# Altium schematic symbol library Analog Devices Data Converters Digital-to-Analog Converters.SchLib: 2231 symbols (part 3 of 135) (continued)
## AD557JPZ-REEL
designator U?
Single 8-Bit Low Cost Complete uP-Compatible DACPORT, 0 to +70 degC, P-20A, Pb-Free, Reel; Generic Part Number: AD557; Manufacturer: Analog Devices; PartNumber: AD557JPZ-REEL; # DAC Outputs: 1; Max V+: 5.5V; Op Pwr Diss: 125mW; Resolution (Bits): 8; Settling Time: 800ns; Single Supply: Yes; DatasheetVersion: Rev.B; PackageVersion: Nov-2002; PackageReference: P-20A; PackageDescription: 20-Lead Plastic Leaded Chip Carrier [PLCC]; Supplier 1: Digi-Key; Supplier Part Number 1: AD557JPZ-REEL-ND; Supplier 2: Newark; Supplier Part Number 2: 12M8563; Supplier 3: Mouser; Supplier Part Number 3: 584-AD557JPZ-R; Packing: Reel; RoHS: Y; Mounting Technology: Surface Mount; Code_JEDEC: MO-047-AA; ComponentLink1Description: Manufacturer URL; ComponentLink1URL: http://www.analog.com/en/index.html; ComponentLink2Description: Datasheet; ComponentLink2URL: http://www.analog.com/static/imported-files/data_sheets/AD557.pdf; ComponentLink3Description: Package Specification; ComponentLink3URL: http://www.analog.com/static/imported-files/packages/3121431516544404277643669223804694P20A.pdf; ComponentLink4Description: Product URL; ComponentLink4URL: http://www.analog.com/en/digital-to-analog-converters/da-converters/ad557/products/product.html
footprint P-20A_N (Leaded Chip Carrier, 20-Leads, Body 9x9mm, Pitch 1.27mm, IPC Medium Density)
footprint P-20A_L (Leaded Chip Carrier, 20-Leads, Body 9x9mm, Pitch 1.27mm, IPC High Density)
footprint P-20A_M (Leaded Chip Carrier, 20-Leads, Body 9x9mm, Pitch 1.27mm, IPC Low Density)
pins: 1 NC, 2 BIT8 (LSB) (in), 3 BIT7 (in), 4 BIT6 (in), 5 BIT5 (in), 6 NC, 7 BIT4 (in), 8 BIT3 (in), 9 BIT2 (in), 10 (MSB) BIT1 (in), 11 NC, 12 ~{CE} (in), 13 ~{CS} (in), 14 +VCC (power), 15 GND (power), 16 NC, 17 GND (power), 18 VOUTSENSEB (in), 19 VOUTSENSEA (in), 20 VOUT (out)

## AD557JPZ-REEL7
designator U?
Single 8-Bit Low Cost Complete uP-Compatible DACPORT, 0 to +70 degC, P-20A, Pb-Free, Reel; Generic Part Number: AD557; Manufacturer: Analog Devices; PartNumber: AD557JPZ-REEL7; # DAC Outputs: 1; Max V+: 5.5V; Op Pwr Diss: 125mW; Resolution (Bits): 8; Settling Time: 800ns; Single Supply: Yes; DatasheetVersion: Rev.B; PackageVersion: Nov-2002; PackageReference: P-20A; PackageDescription: 20-Lead Plastic Leaded Chip Carrier [PLCC]; Supplier 1: Digi-Key; Supplier Part Number 1: AD557JPZ-REEL7-ND; Supplier 2: Newark; Supplier Part Number 2: 12M8564; Supplier 3: Mouser; Supplier Part Number 3: 584-AD557JPZ-R7; Packing: Reel; RoHS: Y; Mounting Technology: Surface Mount; Code_JEDEC: MO-047-AA; ComponentLink1Description: Manufacturer URL; ComponentLink1URL: http://www.analog.com/en/index.html; ComponentLink2Description: Datasheet; ComponentLink2URL: http://www.analog.com/static/imported-files/data_sheets/AD557.pdf; ComponentLink3Description: Package Specification; ComponentLink3URL: http://www.analog.com/static/imported-files/packages/3121431516544404277643669223804694P20A.pdf; ComponentLink4Description: Product URL; ComponentLink4URL: http://www.analog.com/en/digital-to-analog-converters/da-converters/ad557/products/product.html
footprint P-20A_N (Leaded Chip Carrier, 20-Leads, Body 9x9mm, Pitch 1.27mm, IPC Medium Density)
footprint P-20A_L (Leaded Chip Carrier, 20-Leads, Body 9x9mm, Pitch 1.27mm, IPC High Density)
footprint P-20A_M (Leaded Chip Carrier, 20-Leads, Body 9x9mm, Pitch 1.27mm, IPC Low Density)
pins: 1 NC, 2 BIT8 (LSB) (in), 3 BIT7 (in), 4 BIT6 (in), 5 BIT5 (in), 6 NC, 7 BIT4 (in), 8 BIT3 (in), 9 BIT2 (in), 10 (MSB) BIT1 (in), 11 NC, 12 ~{CE} (in), 13 ~{CS} (in), 14 +VCC (power), 15 GND (power), 16 NC, 17 GND (power), 18 VOUTSENSEB (in), 19 VOUTSENSEA (in), 20 VOUT (out)

## AD558JD
designator U?
Single 8-Bit Low Cost Complete uP-Compatible DACPORT, 0 to +70 degC, D-16, Tube; Generic Part Number: AD558; Manufacturer: Analog Devices; PartNumber: AD558JD; # DAC Outputs: 1; Max V+: 16.5V; Op Pwr Diss: 375mW; Resolution (Bits): 8; Settling Time: 800ns; Single Supply: Yes; DatasheetVersion: Rev.A; PackageVersion: Oct-2004; PackageReference: D-16; PackageDescription: 16-Lead Side-Brazed Ceramic Dual In-Line Package [SBDIP]; Supplier 1: Digi-Key; Supplier Part Number 1: AD558JD-ND; Supplier 2: Newark; Supplier Part Number 2: 05F6976; Supplier 3: Mouser; Supplier Part Number 3: 584-AD558JD; Packing: Tube; RoHS: N; Mounting Technology: Through Hole; ComponentLink1Description: Manufacturer URL; ComponentLink1URL: http://www.analog.com/en/index.html; ComponentLink2Description: Datasheet; ComponentLink2URL: http://www.analog.com/static/imported-files/data_sheets/AD558.pdf; ComponentLink3Description: Package Specification; ComponentLink3URL: http://www.analog.com/static/imported-files/packages/411773807540737148809448D_16.pdf; ComponentLink4Description: Product URL; ComponentLink4URL: http://www.analog.com/en/digital-to-analog-converters/da-converters/ad558/products/product.html
footprint D-16 (DIP, 16-Leads, Row Spacing 7.62mm, Pitch 2.54mm, Body 21.3x6.7mm)
pins: 1 (LSB)  DB0 (in), 2 DB1 (in), 3 DB2 (in), 4 DB3 (in), 5 DB4 (in), 6 DB5 (in), 7 DB6 (in), 8 (MSB) DB7 (in), 9 ~{CE} (in), 10 ~{CS} (in), 11 +VCC (power), 12 GND (power), 13 GND (power), 14 VOUTSELECT (in), 15 VOUTSENSE (in), 16 VOUT (out)

## AD558JN
designator U?
Single 8-Bit Low Cost Complete uP-Compatible DACPORT, 0 to +70 degC, N-16, Tube; Generic Part Number: AD558; Manufacturer: Analog Devices; PartNumber: AD558JN; # DAC Outputs: 1; Max V+: 16.5V; Op Pwr Diss: 375mW; Resolution (Bits): 8; Settling Time: 800ns; Single Supply: Yes; DatasheetVersion: Rev.A; PackageVersion: 070706-A; PackageReference: N-16; PackageDescription: 16-Lead Plastic Dual In-Line Package [PDIP] Narrow Body; Supplier 1: Digi-Key; Supplier Part Number 1: AD558JN-ND; Supplier 2: Mouser; Supplier Part Number 2: 584-AD558JN; Packing: Tube; RoHS: N; Mounting Technology: Through Hole; Code_JEDEC: MS-001; ComponentLink1Description: Manufacturer URL; ComponentLink1URL: http://www.analog.com/en/index.html; ComponentLink2Description: Datasheet; ComponentLink2URL: http://www.analog.com/static/imported-files/data_sheets/AD558.pdf; ComponentLink3Description: Package Specification; ComponentLink3URL: http://www.analog.com/static/imported-files/packages/44768431550332N_16.pdf; ComponentLink4Description: Product URL; ComponentLink4URL: http://www.analog.com/en/digital-to-analog-converters/da-converters/ad558/products/product.html
footprint N-16 (DIP, 16-Leads, Row Spacing 7.62mm, Pitch 2.54mm, Body 20.1x6.6mm)
pins: 1 (LSB) DB0 (in), 2 DB1 (in), 3 DB2 (in), 4 DB3 (in), 5 DB4 (in), 6 DB5 (in), 7 DB6 (in), 8 (MSB) DB7 (in), 9 ~{CE} (in), 10 ~{CS} (in), 11 +VCC (power), 12 GND (power), 13 GND (power), 14 VOUT SELECT (in), 15 VOUT SENSE (in), 16 VOUT (out)

## AD558JNZ
designator U?
Single 8-Bit Low Cost Complete uP-Compatible DACPORT, 0 to +70 degC, N-16, Pb-Free, Tube; Generic Part Number: AD558; Manufacturer: Analog Devices; PartNumber: AD558JNZ; # DAC Outputs: 1; Max V+: 16.5V; Op Pwr Diss: 375mW; Resolution (Bits): 8; Settling Time: 800ns; Single Supply: Yes; DatasheetVersion: Rev.A; PackageVersion: 070706-A; PackageReference: N-16; PackageDescription: 16-Lead Plastic Dual In-Line Package [PDIP] Narrow Body; Supplier 1: Digi-Key; Supplier Part Number 1: AD558JNZ-ND; Supplier 2: Farnell; Supplier Part Number 2: 1079362; Supplier 3: Farnell; Supplier Part Number 3: 1523778; Supplier 4: Newark; Supplier Part Number 4: 59K4249; Supplier 5: Mouser; Supplier Part Number 5: 584-AD558JNZ; Packing: Tube; RoHS: Y; Mounting Technology: Through Hole; Code_JEDEC: MS-001; ComponentLink1Description: Manufacturer URL; ComponentLink1URL: http://www.analog.com/en/index.html; ComponentLink2Description: Datasheet; ComponentLink2URL: http://www.analog.com/static/imported-files/data_sheets/AD558.pdf; ComponentLink3Description: Package Specification; ComponentLink3URL: http://www.analog.com/static/imported-files/packages/44768431550332N_16.pdf; ComponentLink4Description: Product URL; ComponentLink4URL: http://www.analog.com/en/digital-to-analog-converters/da-converters/ad558/products/product.html
footprint N-16 (DIP, 16-Leads, Row Spacing 7.62mm, Pitch 2.54mm, Body 20.1x6.6mm)
pins: 1 (LSB) DB0 (in), 2 DB1 (in), 3 DB2 (in), 4 DB3 (in), 5 DB4 (in), 6 DB5 (in), 7 DB6 (in), 8 (MSB) DB7 (in), 9 ~{CE} (in), 10 ~{CS} (in), 11 +VCC (power), 12 GND (power), 13 GND (power), 14 VOUT SELECT (in), 15 VOUT SENSE (in), 16 VOUT (out)

## AD558JP
designator U?
Single 8-Bit Low Cost Complete uP-Compatible DACPORT, 0 to +70 degC, P-20A, Tube; Generic Part Number: AD558; Manufacturer: Analog Devices; PartNumber: AD558JP; # DAC Outputs: 1; Max V+: 16.5V; Op Pwr Diss: 375mW; Resolution (Bits): 8; Settling Time: 800ns; Single Supply: Yes; DatasheetVersion: Rev.A; PackageVersion: Nov-2002; PackageReference: P-20A; PackageDescription: 20-Lead Plastic Leaded Chip Carrier [PLCC]; Supplier 1: Digi-Key; Supplier Part Number 1: AD558JP-ND; Supplier 2: Newark; Supplier Part Number 2: 05F6978; Supplier 3: Mouser; Supplier Part Number 3: 584-AD558JP; Packing: Tube; RoHS: N; Mounting Technology: Surface Mount; Code_JEDEC: MO-047-AA; ComponentLink1Description: Manufacturer URL; ComponentLink1URL: http://www.analog.com/en/index.html; ComponentLink2Description: Datasheet; ComponentLink2URL: http://www.analog.com/static/imported-files/data_sheets/AD558.pdf; ComponentLink3Description: Package Specification; ComponentLink3URL: http://www.analog.com/static/imported-files/packages/3121431516544404277643669223804694P20A.pdf; ComponentLink4Description: Product URL; ComponentLink4URL: http://www.analog.com/en/digital-to-analog-converters/da-converters/ad558/products/product.html
footprint P-20A_N (Leaded Chip Carrier, 20-Leads, Body 9x9mm, Pitch 1.27mm, IPC Medium Density)
footprint P-20A_L (Leaded Chip Carrier, 20-Leads, Body 9x9mm, Pitch 1.27mm, IPC High Density)
footprint P-20A_M (Leaded Chip Carrier, 20-Leads, Body 9x9mm, Pitch 1.27mm, IPC Low Density)
pins: 1 NC, 2 DB0 (LSB) (in), 3 DB1 (in), 4 DB2 (in), 5 DB3 (in), 6 NC, 7 DB4 (in), 8 DB5 (in), 9 DB6 (in), 10 (MSB) DB7 (in), 11 NC, 12 ~{CE} (in), 13 ~{CS} (in), 14 +VCC (power), 15 GND (power), 16 NC, 17 GND (power), 18 VOUT SELECT (in), 19 VOUT SENSE (in), 20 VOUT (out)

## AD558JP-REEL7
designator U?
Single 8-Bit Low Cost Complete uP-Compatible DACPORT, 0 to +70 degC, P-20A, Reel; Generic Part Number: AD558; Manufacturer: Analog Devices; PartNumber: AD558JP-REEL7; # DAC Outputs: 1; Max V+: 16.5V; Op Pwr Diss: 375mW; Resolution (Bits): 8; Settling Time: 800ns; Single Supply: Yes; DatasheetVersion: Rev.A; PackageVersion: Nov-2002; PackageReference: P-20A; PackageDescription: 20-Lead Plastic Leaded Chip Carrier [PLCC]; Supplier 1: Digi-Key; Supplier Part Number 1: AD558JP-REEL7-ND; Supplier 2: Newark; Supplier Part Number 2: 09B5242; Supplier 3: Mouser; Supplier Part Number 3: 584-AD558JP-R7; Packing: Reel; RoHS: N; Mounting Technology: Surface Mount; Code_JEDEC: MO-047-AA; ComponentLink1Description: Manufacturer URL; ComponentLink1URL: http://www.analog.com/en/index.html; ComponentLink2Description: Datasheet; ComponentLink2URL: http://www.analog.com/static/imported-files/data_sheets/AD558.pdf; ComponentLink3Description: Package Specification; ComponentLink3URL: http://www.analog.com/static/imported-files/packages/3121431516544404277643669223804694P20A.pdf; ComponentLink4Description: Product URL; ComponentLink4URL: http://www.analog.com/en/digital-to-analog-converters/da-converters/ad558/products/product.html
footprint P-20A_N (Leaded Chip Carrier, 20-Leads, Body 9x9mm, Pitch 1.27mm, IPC Medium Density)
footprint P-20A_L (Leaded Chip Carrier, 20-Leads, Body 9x9mm, Pitch 1.27mm, IPC High Density)
footprint P-20A_M (Leaded Chip Carrier, 20-Leads, Body 9x9mm, Pitch 1.27mm, IPC Low Density)
pins: 1 NC, 2 DB0 (LSB) (in), 3 DB1 (in), 4 DB2 (in), 5 DB3 (in), 6 NC, 7 DB4 (in), 8 DB5 (in), 9 DB6 (in), 10 (MSB) DB7 (in), 11 NC, 12 ~{CE} (in), 13 ~{CS} (in), 14 +VCC (power), 15 GND (power), 16 NC, 17 GND (power), 18 VOUT SELECT (in), 19 VOUT SENSE (in), 20 VOUT (out)

## AD558JPZ
designator U?
Single 8-Bit Low Cost Complete uP-Compatible DACPORT, 0 to +70 degC, P-20A, Pb-Free, Tube; Generic Part Number: AD558; Manufacturer: Analog Devices; PartNumber: AD558JPZ; # DAC Outputs: 1; Max V+: 16.5V; Op Pwr Diss: 375mW; Resolution (Bits): 8; Settling Time: 800ns; Single Supply: Yes; DatasheetVersion: Rev.A; PackageVersion: Nov-2002; PackageReference: P-20A; PackageDescription: 20-Lead Plastic Leaded Chip Carrier [PLCC]; Supplier 1: Digi-Key; Supplier Part Number 1: AD558JPZ-ND; Supplier 2: Newark; Supplier Part Number 2: 07P8933; Supplier 3: Mouser; Supplier Part Number 3: 584-AD558JPZ; Packing: Tube; RoHS: Y; Mounting Technology: Surface Mount; Code_JEDEC: MO-047-AA; ComponentLink1Description: Manufacturer URL; ComponentLink1URL: http://www.analog.com/en/index.html; ComponentLink2Description: Datasheet; ComponentLink2URL: http://www.analog.com/static/imported-files/data_sheets/AD558.pdf; ComponentLink3Description: Package Specification; ComponentLink3URL: http://www.analog.com/static/imported-files/packages/3121431516544404277643669223804694P20A.pdf; ComponentLink4Description: Product URL; ComponentLink4URL: http://www.analog.com/en/digital-to-analog-converters/da-converters/ad558/products/product.html
footprint P-20A_N (Leaded Chip Carrier, 20-Leads, Body 9x9mm, Pitch 1.27mm, IPC Medium Density)
footprint P-20A_L (Leaded Chip Carrier, 20-Leads, Body 9x9mm, Pitch 1.27mm, IPC High Density)
footprint P-20A_M (Leaded Chip Carrier, 20-Leads, Body 9x9mm, Pitch 1.27mm, IPC Low Density)
pins: 1 NC, 2 DB0 (LSB) (in), 3 DB1 (in), 4 DB2 (in), 5 DB3 (in), 6 NC, 7 DB4 (in), 8 DB5 (in), 9 DB6 (in), 10 (MSB) DB7 (in), 11 NC, 12 ~{CE} (in), 13 ~{CS} (in), 14 +VCC (power), 15 GND (power), 16 NC, 17 GND (power), 18 VOUT SELECT (in), 19 VOUT SENSE (in), 20 VOUT (out)

## AD558JPZ-REEL
designator U?
Single 8-Bit Low Cost Complete uP-Compatible DACPORT, 0 to +70 degC, P-20A, Pb-Free, Reel; Generic Part Number: AD558; Manufacturer: Analog Devices; PartNumber: AD558JPZ-REEL; # DAC Outputs: 1; Max V+: 16.5V; Op Pwr Diss: 375mW; Resolution (Bits): 8; Settling Time: 800ns; Single Supply: Yes; DatasheetVersion: Rev.A; PackageVersion: Nov-2002; PackageReference: P-20A; PackageDescription: 20-Lead Plastic Leaded Chip Carrier [PLCC]; Supplier 1: Mouser; Supplier Part Number 1: N/A; Packing: Reel; RoHS: Y; Mounting Technology: Surface Mount; Code_JEDEC: MO-047-AA; ComponentLink1Description: Manufacturer URL; ComponentLink1URL: http://www.analog.com/en/index.html; ComponentLink2Description: Datasheet; ComponentLink2URL: http://www.analog.com/static/imported-files/data_sheets/AD558.pdf; ComponentLink3Description: Package Specification; ComponentLink3URL: http://www.analog.com/static/imported-files/packages/3121431516544404277643669223804694P20A.pdf; ComponentLink4Description: Product URL; ComponentLink4URL: http://www.analog.com/en/digital-to-analog-converters/da-converters/ad558/products/product.html
footprint P-20A_N (Leaded Chip Carrier, 20-Leads, Body 9x9mm, Pitch 1.27mm, IPC Medium Density)
footprint P-20A_L (Leaded Chip Carrier, 20-Leads, Body 9x9mm, Pitch 1.27mm, IPC High Density)
footprint P-20A_M (Leaded Chip Carrier, 20-Leads, Body 9x9mm, Pitch 1.27mm, IPC Low Density)
pins: 1 NC, 2 DB0 (LSB) (in), 3 DB1 (in), 4 DB2 (in), 5 DB3 (in), 6 NC, 7 DB4 (in), 8 DB5 (in), 9 DB6 (in), 10 (MSB) DB7 (in), 11 NC, 12 ~{CE} (in), 13 ~{CS} (in), 14 +VCC (power), 15 GND (power), 16 NC, 17 GND (power), 18 VOUT SELECT (in), 19 VOUT SENSE (in), 20 VOUT (out)

## AD558JPZ-REEL7
designator U?
Single 8-Bit Low Cost Complete uP-Compatible DACPORT, 0 to +70 degC, P-20A, Pb-Free, Reel; Generic Part Number: AD558; Manufacturer: Analog Devices; PartNumber: AD558JPZ-REEL7; # DAC Outputs: 1; Max V+: 16.5V; Op Pwr Diss: 375mW; Resolution (Bits): 8; Settling Time: 800ns; Single Supply: Yes; DatasheetVersion: Rev.A; PackageVersion: Nov-2002; PackageReference: P-20A; PackageDescription: 20-Lead Plastic Leaded Chip Carrier [PLCC]; Supplier 1: Digi-Key; Supplier Part Number 1: AD558JPZ-REEL7-ND; Supplier 2: Newark; Supplier Part Number 2: 59K4250; Supplier 3: Mouser; Supplier Part Number 3: 584-AD558JPZ-R7; Packing: Reel; RoHS: Y; Mounting Technology: Surface Mount; Code_JEDEC: MO-047-AA; ComponentLink1Description: Manufacturer URL; ComponentLink1URL: http://www.analog.com/en/index.html; ComponentLink2Description: Datasheet; ComponentLink2URL: http://www.analog.com/static/imported-files/data_sheets/AD558.pdf; ComponentLink3Description: Package Specification; ComponentLink3URL: http://www.analog.com/static/imported-files/packages/3121431516544404277643669223804694P20A.pdf; ComponentLink4Description: Product URL; ComponentLink4URL: http://www.analog.com/en/digital-to-analog-converters/da-converters/ad558/products/product.html
footprint P-20A_N (Leaded Chip Carrier, 20-Leads, Body 9x9mm, Pitch 1.27mm, IPC Medium Density)
footprint P-20A_L (Leaded Chip Carrier, 20-Leads, Body 9x9mm, Pitch 1.27mm, IPC High Density)
footprint P-20A_M (Leaded Chip Carrier, 20-Leads, Body 9x9mm, Pitch 1.27mm, IPC Low Density)
pins: 1 NC, 2 DB0 (LSB) (in), 3 DB1 (in), 4 DB2 (in), 5 DB3 (in), 6 NC, 7 DB4 (in), 8 DB5 (in), 9 DB6 (in), 10 (MSB) DB7 (in), 11 NC, 12 ~{CE} (in), 13 ~{CS} (in), 14 +VCC (power), 15 GND (power), 16 NC, 17 GND (power), 18 VOUT SELECT (in), 19 VOUT SENSE (in), 20 VOUT (out)

## AD558KD
designator U?
Single 8-Bit Low Cost Complete uP-Compatible DACPORT, 0 to +70 degC, D-16, Tube; Generic Part Number: AD558; Manufacturer: Analog Devices; PartNumber: AD558KD; # DAC Outputs: 1; Max V+: 16.5V; Op Pwr Diss: 375mW; Resolution (Bits): 8; Settling Time: 800ns; Single Supply: Yes; DatasheetVersion: Rev.A; PackageVersion: Oct-2004; PackageReference: D-16; PackageDescription: 16-Lead Side-Brazed Ceramic Dual In-Line Package [SBDIP]; Supplier 1: Digi-Key; Supplier Part Number 1: AD558KD-ND; Supplier 2: Newark; Supplier Part Number 2: 05F6979; Supplier 3: Mouser; Supplier Part Number 3: 584-AD558KD; Packing: Tube; RoHS: N; Mounting Technology: Through Hole; ComponentLink1Description: Manufacturer URL; ComponentLink1URL: http://www.analog.com/en/index.html; ComponentLink2Description: Datasheet; ComponentLink2URL: http://www.analog.com/static/imported-files/data_sheets/AD558.pdf; ComponentLink3Description: Package Specification; ComponentLink3URL: http://www.analog.com/static/imported-files/packages/411773807540737148809448D_16.pdf; ComponentLink4Description: Product URL; ComponentLink4URL: http://www.analog.com/en/digital-to-analog-converters/da-converters/ad558/products/product.html
footprint D-16 (DIP, 16-Leads, Row Spacing 7.62mm, Pitch 2.54mm, Body 21.3x6.7mm)
pins: 1 (LSB)  DB0 (in), 2 DB1 (in), 3 DB2 (in), 4 DB3 (in), 5 DB4 (in), 6 DB5 (in), 7 DB6 (in), 8 (MSB) DB7 (in), 9 ~{CE} (in), 10 ~{CS} (in), 11 +VCC (power), 12 GND (power), 13 GND (power), 14 VOUTSELECT (in), 15 VOUTSENSE (in), 16 VOUT (out)

## AD558KN
designator U?
Single 8-Bit Low Cost Complete uP-Compatible DACPORT, 0 to +70 degC, N-16, Tube; Generic Part Number: AD558; Manufacturer: Analog Devices; PartNumber: AD558KN; # DAC Outputs: 1; Max V+: 16.5V; Op Pwr Diss: 375mW; Resolution (Bits): 8; Settling Time: 800ns; Single Supply: Yes; DatasheetVersion: Rev.A; PackageVersion: 070706-A; PackageReference: N-16; PackageDescription: 16-Lead Plastic Dual In-Line Package [PDIP] Narrow Body; Supplier 1: Digi-Key; Supplier Part Number 1: AD558KN-ND; Supplier 2: Mouser; Supplier Part Number 2: 584-AD558KN; Packing: Tube; RoHS: N; Mounting Technology: Through Hole; Code_JEDEC: MS-001; ComponentLink1Description: Manufacturer URL; ComponentLink1URL: http://www.analog.com/en/index.html; ComponentLink2Description: Datasheet; ComponentLink2URL: http://www.analog.com/static/imported-files/data_sheets/AD558.pdf; ComponentLink3Description: Package Specification; ComponentLink3URL: http://www.analog.com/static/imported-files/packages/44768431550332N_16.pdf; ComponentLink4Description: Product URL; ComponentLink4URL: http://www.analog.com/en/digital-to-analog-converters/da-converters/ad558/products/product.html
footprint N-16 (DIP, 16-Leads, Row Spacing 7.62mm, Pitch 2.54mm, Body 20.1x6.6mm)
pins: 1 (LSB) DB0 (in), 2 DB1 (in), 3 DB2 (in), 4 DB3 (in), 5 DB4 (in), 6 DB5 (in), 7 DB6 (in), 8 (MSB) DB7 (in), 9 ~{CE} (in), 10 ~{CS} (in), 11 +VCC (power), 12 GND (power), 13 GND (power), 14 VOUT SELECT (in), 15 VOUT SENSE (in), 16 VOUT (out)

## AD558KNZ
designator U?
Single 8-Bit Low Cost Complete uP-Compatible DACPORT, 0 to +70 degC, N-16, Pb-Free, Tube; Generic Part Number: AD558; Manufacturer: Analog Devices; PartNumber: AD558KNZ; # DAC Outputs: 1; Max V+: 16.5V; Op Pwr Diss: 375mW; Resolution (Bits): 8; Settling Time: 800ns; Single Supply: Yes; DatasheetVersion: Rev.A; PackageVersion: 070706-A; PackageReference: N-16; PackageDescription: 16-Lead Plastic Dual In-Line Package [PDIP] Narrow Body; Supplier 1: Digi-Key; Supplier Part Number 1: AD558KNZ-ND; Supplier 2: Farnell; Supplier Part Number 2: 1438378; Supplier 3: Newark; Supplier Part Number 3: 59K4251; Supplier 4: Mouser; Supplier Part Number 4: 584-AD558KNZ; Packing: Tube; RoHS: Y; Mounting Technology: Through Hole; Code_JEDEC: MS-001; ComponentLink1Description: Manufacturer URL; ComponentLink1URL: http://www.analog.com/en/index.html; ComponentLink2Description: Datasheet; ComponentLink2URL: http://www.analog.com/static/imported-files/data_sheets/AD558.pdf; ComponentLink3Description: Package Specification; ComponentLink3URL: http://www.analog.com/static/imported-files/packages/44768431550332N_16.pdf; ComponentLink4Description: Product URL; ComponentLink4URL: http://www.analog.com/en/digital-to-analog-converters/da-converters/ad558/products/product.html
footprint N-16 (DIP, 16-Leads, Row Spacing 7.62mm, Pitch 2.54mm, Body 20.1x6.6mm)
pins: 1 (LSB) DB0 (in), 2 DB1 (in), 3 DB2 (in), 4 DB3 (in), 5 DB4 (in), 6 DB5 (in), 7 DB6 (in), 8 (MSB) DB7 (in), 9 ~{CE} (in), 10 ~{CS} (in), 11 +VCC (power), 12 GND (power), 13 GND (power), 14 VOUT SELECT (in), 15 VOUT SENSE (in), 16 VOUT (out)

## AD558KP
designator U?
Single 8-Bit Low Cost Complete uP-Compatible DACPORT, 0 to +70 degC, P-20A, Tube; Generic Part Number: AD558; Manufacturer: Analog Devices; PartNumber: AD558KP; # DAC Outputs: 1; Max V+: 16.5V; Op Pwr Diss: 375mW; Resolution (Bits): 8; Settling Time: 800ns; Single Supply: Yes; DatasheetVersion: Rev.A; PackageVersion: Nov-2002; PackageReference: P-20A; PackageDescription: 20-Lead Plastic Leaded Chip Carrier [PLCC]; Supplier 1: Digi-Key; Supplier Part Number 1: AD558KP-ND; Supplier 2: Mouser; Supplier Part Number 2: 584-AD558KP; Packing: Tube; RoHS: N; Mounting Technology: Surface Mount; Code_JEDEC: MO-047-AA; ComponentLink1Description: Manufacturer URL; ComponentLink1URL: http://www.analog.com/en/index.html; ComponentLink2Description: Datasheet; ComponentLink2URL: http://www.analog.com/static/imported-files/data_sheets/AD558.pdf; ComponentLink3Description: Package Specification; ComponentLink3URL: http://www.analog.com/static/imported-files/packages/3121431516544404277643669223804694P20A.pdf; ComponentLink4Description: Product URL; ComponentLink4URL: http://www.analog.com/en/digital-to-analog-converters/da-converters/ad558/products/product.html
footprint P-20A_N (Leaded Chip Carrier, 20-Leads, Body 9x9mm, Pitch 1.27mm, IPC Medium Density)
footprint P-20A_L (Leaded Chip Carrier, 20-Leads, Body 9x9mm, Pitch 1.27mm, IPC High Density)
footprint P-20A_M (Leaded Chip Carrier, 20-Leads, Body 9x9mm, Pitch 1.27mm, IPC Low Density)
pins: 1 NC, 2 DB0 (LSB) (in), 3 DB1 (in), 4 DB2 (in), 5 DB3 (in), 6 NC, 7 DB4 (in), 8 DB5 (in), 9 DB6 (in), 10 (MSB) DB7 (in), 11 NC, 12 ~{CE} (in), 13 ~{CS} (in), 14 +VCC (power), 15 GND (power), 16 NC, 17 GND (power), 18 VOUT SELECT (in), 19 VOUT SENSE (in), 20 VOUT (out)

## AD558KP-REEL7
designator U?
Single 8-Bit Low Cost Complete uP-Compatible DACPORT, 0 to +70 degC, P-20A, Reel; Generic Part Number: AD558; Manufacturer: Analog Devices; PartNumber: AD558KP-REEL7; # DAC Outputs: 1; Max V+: 16.5V; Op Pwr Diss: 375mW; Resolution (Bits): 8; Settling Time: 800ns; Single Supply: Yes; DatasheetVersion: Rev.A; PackageVersion: Nov-2002; PackageReference: P-20A; PackageDescription: 20-Lead Plastic Leaded Chip Carrier [PLCC]; Supplier 1: Digi-Key; Supplier Part Number 1: AD558KP-REEL7-ND; Supplier 2: Mouser; Supplier Part Number 2: 584-AD558KP-R7; Packing: Reel; RoHS: N; Mounting Technology: Surface Mount; Code_JEDEC: MO-047-AA; ComponentLink1Description: Manufacturer URL; ComponentLink1URL: http://www.analog.com/en/index.html; ComponentLink2Description: Datasheet; ComponentLink2URL: http://www.analog.com/static/imported-files/data_sheets/AD558.pdf; ComponentLink3Description: Package Specification; ComponentLink3URL: http://www.analog.com/static/imported-files/packages/3121431516544404277643669223804694P20A.pdf; ComponentLink4Description: Product URL; ComponentLink4URL: http://www.analog.com/en/digital-to-analog-converters/da-converters/ad558/products/product.html
footprint P-20A_N (Leaded Chip Carrier, 20-Leads, Body 9x9mm, Pitch 1.27mm, IPC Medium Density)
footprint P-20A_L (Leaded Chip Carrier, 20-Leads, Body 9x9mm, Pitch 1.27mm, IPC High Density)
footprint P-20A_M (Leaded Chip Carrier, 20-Leads, Body 9x9mm, Pitch 1.27mm, IPC Low Density)
pins: 1 NC, 2 DB0 (LSB) (in), 3 DB1 (in), 4 DB2 (in), 5 DB3 (in), 6 NC, 7 DB4 (in), 8 DB5 (in), 9 DB6 (in), 10 (MSB) DB7 (in), 11 NC, 12 ~{CE} (in), 13 ~{CS} (in), 14 +VCC (power), 15 GND (power), 16 NC, 17 GND (power), 18 VOUT SELECT (in), 19 VOUT SENSE (in), 20 VOUT (out)

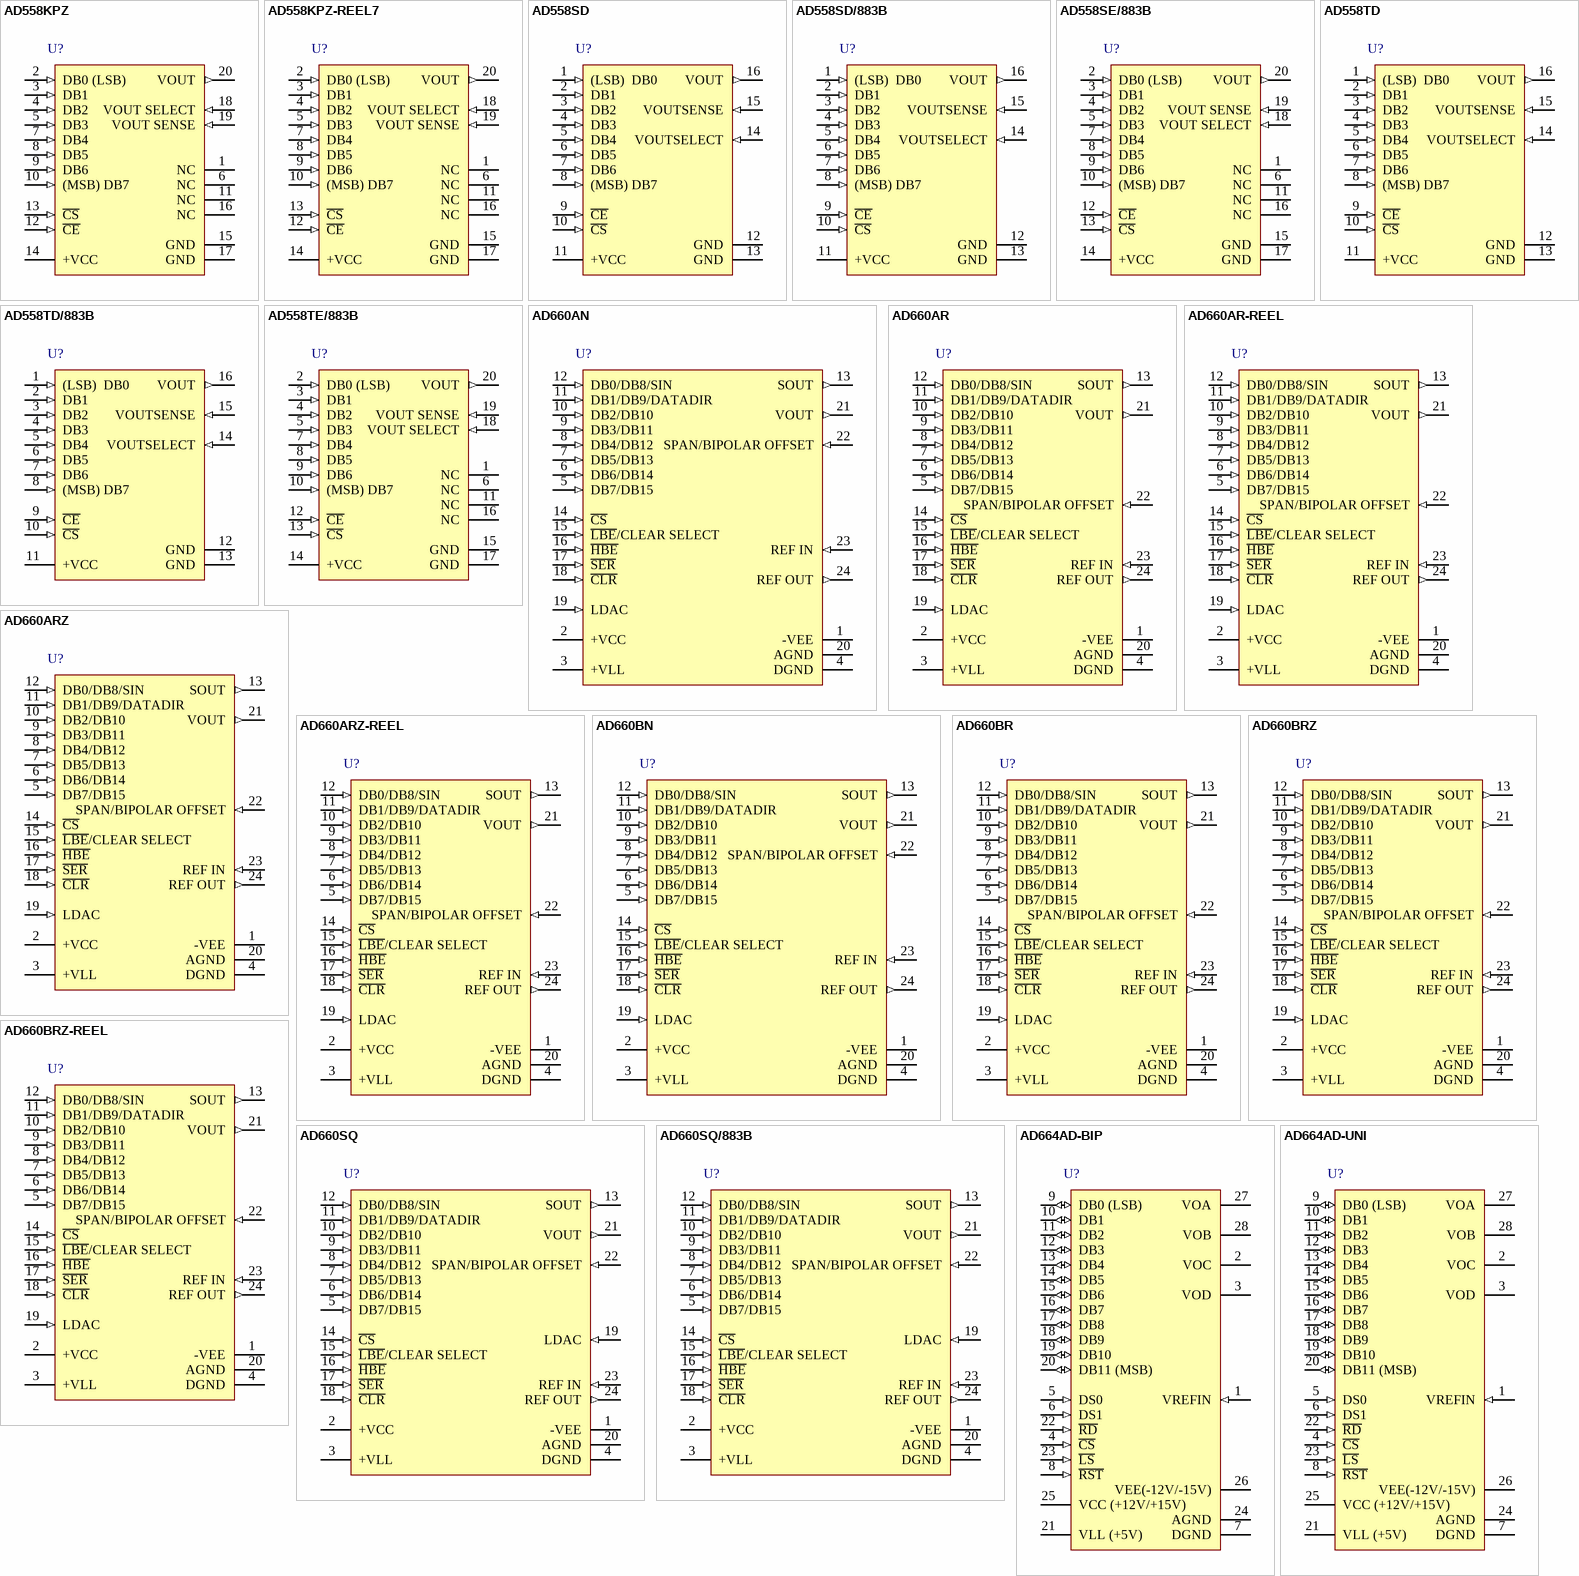
[diagram p3: symbols AD558KPZ to AD664AD-UNI]

## AD558KPZ
designator U?
Single 8-Bit Low Cost Complete uP-Compatible DACPORT, 0 to +70 degC, P-20A, Pb-Free, Tube; Generic Part Number: AD558; Manufacturer: Analog Devices; PartNumber: AD558KPZ; # DAC Outputs: 1; Max V+: 16.5V; Op Pwr Diss: 375mW; Resolution (Bits): 8; Settling Time: 800ns; Single Supply: Yes; DatasheetVersion: Rev.A; PackageVersion: Nov-2002; PackageReference: P-20A; PackageDescription: 20-Lead Plastic Leaded Chip Carrier [PLCC]; Supplier 1: Digi-Key; Supplier Part Number 1: AD558KPZ-ND; Supplier 2: Newark; Supplier Part Number 2: 59K4253; Supplier 3: Mouser; Supplier Part Number 3: 584-AD558KPZ; Packing: Tube; RoHS: Y; Mounting Technology: Surface Mount; Code_JEDEC: MO-047-AA; ComponentLink1Description: Manufacturer URL; ComponentLink1URL: http://www.analog.com/en/index.html; ComponentLink2Description: Datasheet; ComponentLink2URL: http://www.analog.com/static/imported-files/data_sheets/AD558.pdf; ComponentLink3Description: Package Specification; ComponentLink3URL: http://www.analog.com/static/imported-files/packages/3121431516544404277643669223804694P20A.pdf; ComponentLink4Description: Product URL; ComponentLink4URL: http://www.analog.com/en/digital-to-analog-converters/da-converters/ad558/products/product.html
footprint P-20A_N (Leaded Chip Carrier, 20-Leads, Body 9x9mm, Pitch 1.27mm, IPC Medium Density)
footprint P-20A_L (Leaded Chip Carrier, 20-Leads, Body 9x9mm, Pitch 1.27mm, IPC High Density)
footprint P-20A_M (Leaded Chip Carrier, 20-Leads, Body 9x9mm, Pitch 1.27mm, IPC Low Density)
pins: 1 NC, 2 DB0 (LSB) (in), 3 DB1 (in), 4 DB2 (in), 5 DB3 (in), 6 NC, 7 DB4 (in), 8 DB5 (in), 9 DB6 (in), 10 (MSB) DB7 (in), 11 NC, 12 ~{CE} (in), 13 ~{CS} (in), 14 +VCC (power), 15 GND (power), 16 NC, 17 GND (power), 18 VOUT SELECT (in), 19 VOUT SENSE (in), 20 VOUT (out)

## AD558KPZ-REEL7
designator U?
Single 8-Bit Low Cost Complete uP-Compatible DACPORT, 0 to +70 degC, P-20A, Pb-Free, Reel; Generic Part Number: AD558; Manufacturer: Analog Devices; PartNumber: AD558KPZ-REEL7; # DAC Outputs: 1; Max V+: 16.5V; Op Pwr Diss: 375mW; Resolution (Bits): 8; Settling Time: 800ns; Single Supply: Yes; DatasheetVersion: Rev.A; PackageVersion: Nov-2002; PackageReference: P-20A; PackageDescription: 20-Lead Plastic Leaded Chip Carrier [PLCC]; Supplier 1: Digi-Key; Supplier Part Number 1: AD558KPZ-REEL7-ND; Supplier 2: Mouser; Supplier Part Number 2: 584-AD558KPZ-R7; Packing: Reel; RoHS: Y; Mounting Technology: Surface Mount; Code_JEDEC: MO-047-AA; ComponentLink1Description: Manufacturer URL; ComponentLink1URL: http://www.analog.com/en/index.html; ComponentLink2Description: Datasheet; ComponentLink2URL: http://www.analog.com/static/imported-files/data_sheets/AD558.pdf; ComponentLink3Description: Package Specification; ComponentLink3URL: http://www.analog.com/static/imported-files/packages/3121431516544404277643669223804694P20A.pdf; ComponentLink4Description: Product URL; ComponentLink4URL: http://www.analog.com/en/digital-to-analog-converters/da-converters/ad558/products/product.html
footprint P-20A_N (Leaded Chip Carrier, 20-Leads, Body 9x9mm, Pitch 1.27mm, IPC Medium Density)
footprint P-20A_L (Leaded Chip Carrier, 20-Leads, Body 9x9mm, Pitch 1.27mm, IPC High Density)
footprint P-20A_M (Leaded Chip Carrier, 20-Leads, Body 9x9mm, Pitch 1.27mm, IPC Low Density)
pins: 1 NC, 2 DB0 (LSB) (in), 3 DB1 (in), 4 DB2 (in), 5 DB3 (in), 6 NC, 7 DB4 (in), 8 DB5 (in), 9 DB6 (in), 10 (MSB) DB7 (in), 11 NC, 12 ~{CE} (in), 13 ~{CS} (in), 14 +VCC (power), 15 GND (power), 16 NC, 17 GND (power), 18 VOUT SELECT (in), 19 VOUT SENSE (in), 20 VOUT (out)

## AD558SD
designator U?
Single 8-Bit Low Cost Complete uP-Compatible DACPORT, -55 to +125 degC, D-16, Tube; Generic Part Number: AD558; Manufacturer: Analog Devices; PartNumber: AD558SD; # DAC Outputs: 1; Max V+: 16.5V; Op Pwr Diss: 375mW; Resolution (Bits): 8; Settling Time: 800ns; Single Supply: Yes; DatasheetVersion: Rev.A; PackageVersion: Oct-2004; PackageReference: D-16; PackageDescription: 16-Lead Side-Brazed Ceramic Dual In-Line Package [SBDIP]; Supplier 1: Digi-Key; Supplier Part Number 1: AD558SD-ND; Supplier 2: Mouser; Supplier Part Number 2: 584-AD558SD; Packing: Tube; RoHS: N; Mounting Technology: Through Hole; ComponentLink1Description: Manufacturer URL; ComponentLink1URL: http://www.analog.com/en/index.html; ComponentLink2Description: Datasheet; ComponentLink2URL: http://www.analog.com/static/imported-files/data_sheets/AD558.pdf; ComponentLink3Description: Package Specification; ComponentLink3URL: http://www.analog.com/static/imported-files/packages/411773807540737148809448D_16.pdf; ComponentLink4Description: Product URL; ComponentLink4URL: http://www.analog.com/en/digital-to-analog-converters/da-converters/ad558/products/product.html
footprint D-16 (DIP, 16-Leads, Row Spacing 7.62mm, Pitch 2.54mm, Body 21.3x6.7mm)
pins: 1 (LSB)  DB0 (in), 2 DB1 (in), 3 DB2 (in), 4 DB3 (in), 5 DB4 (in), 6 DB5 (in), 7 DB6 (in), 8 (MSB) DB7 (in), 9 ~{CE} (in), 10 ~{CS} (in), 11 +VCC (power), 12 GND (power), 13 GND (power), 14 VOUTSELECT (in), 15 VOUTSENSE (in), 16 VOUT (out)

## AD558SD/883B
designator U?
Single 8-Bit Low Cost Complete uP-Compatible DACPORT, -55 to +125 degC, D-16, Tube; Generic Part Number: AD558; Manufacturer: Analog Devices; PartNumber: AD558SD/883B; # DAC Outputs: 1; Max V+: 16.5V; Op Pwr Diss: 375mW; Resolution (Bits): 8; Settling Time: 800ns; Single Supply: Yes; DatasheetVersion: Rev.A; PackageVersion: Oct-2004; PackageReference: D-16; PackageDescription: 16-Lead Side-Brazed Ceramic Dual In-Line Package [SBDIP]; Supplier 1: Mouser; Supplier Part Number 1: 584-AD558SD883B; Packing: Tube; RoHS: N; Mounting Technology: Through Hole; ComponentLink1Description: Manufacturer URL; ComponentLink1URL: http://www.analog.com/en/index.html; ComponentLink2Description: Datasheet; ComponentLink2URL: http://www.analog.com/static/imported-files/data_sheets/AD558.pdf; ComponentLink3Description: Package Specification; ComponentLink3URL: http://www.analog.com/static/imported-files/packages/411773807540737148809448D_16.pdf; ComponentLink4Description: Product URL; ComponentLink4URL: http://www.analog.com/en/digital-to-analog-converters/da-converters/ad558/products/product.html
footprint D-16 (DIP, 16-Leads, Row Spacing 7.62mm, Pitch 2.54mm, Body 21.3x6.7mm)
pins: 1 (LSB)  DB0 (in), 2 DB1 (in), 3 DB2 (in), 4 DB3 (in), 5 DB4 (in), 6 DB5 (in), 7 DB6 (in), 8 (MSB) DB7 (in), 9 ~{CE} (in), 10 ~{CS} (in), 11 +VCC (power), 12 GND (power), 13 GND (power), 14 VOUTSELECT (in), 15 VOUTSENSE (in), 16 VOUT (out)

## AD558SE/883B
designator U?
Single 8-Bit Low Cost Complete uP-Compatible DACPORT, -55 to +125 degC, E-20-1, Tube; Generic Part Number: AD558; Manufacturer: Analog Devices; PartNumber: AD558SE/883B; # DAC Outputs: 1; Max V+: 16.5V; Op Pwr Diss: 375mW; Resolution (Bits): 8; Settling Time: 800ns; Single Supply: Yes; DatasheetVersion: Rev.A; PackageVersion: 022106-A; PackageReference: E-20-1; PackageDescription: 20-Terminal Ceramic Leadless Chip Carrier [LCC]; Supplier 1: Mouser; Supplier Part Number 1: 584-AD558SE883B; Packing: Tube; RoHS: N; Mounting Technology: Surface Mount; ComponentLink1Description: Manufacturer URL; ComponentLink1URL: http://www.analog.com/en/index.html; ComponentLink2Description: Datasheet; ComponentLink2URL: http://www.analog.com/static/imported-files/data_sheets/AD558.pdf; ComponentLink3Description: Package Specification; ComponentLink3URL: http://www.analog.com/static/imported-files/packages/PKG_PDF/LCC(E)/E_20_1.pdf; ComponentLink4Description: Product URL; ComponentLink4URL: http://www.analog.com/en/digital-to-analog-converters/da-converters/ad558/products/product.html
footprint E-20-1_N (Leadless Chip Carrier, 20-Leads, Body 8.9x8.9mm, Pitch 1.27mm, IPC Medium Density)
footprint E-20-1_L (Leadless Chip Carrier, 20-Leads, Body 8.9x8.9mm, Pitch 1.27mm, IPC High Density)
footprint E-20-1_M (Leadless Chip Carrier, 20-Leads, Body 8.9x8.9mm, Pitch 1.27mm, IPC Low Density)
pins: 1 NC, 2 DB0 (LSB) (in), 3 DB1 (in), 4 DB2 (in), 5 DB3 (in), 6 NC, 7 DB4 (in), 8 DB5 (in), 9 DB6 (in), 10 (MSB) DB7 (in), 11 NC, 12 ~{CE} (in), 13 ~{CS} (in), 14 +VCC (power), 15 GND (power), 16 NC, 17 GND (power), 18 VOUT SELECT (in), 19 VOUT SENSE (in), 20 VOUT (out)

## AD558TD
designator U?
Single 8-Bit Low Cost Complete uP-Compatible DACPORT, -55 to +125 degC, D-16, Tube; Generic Part Number: AD558; Manufacturer: Analog Devices; PartNumber: AD558TD; # DAC Outputs: 1; Max V+: 16.5V; Op Pwr Diss: 375mW; Resolution (Bits): 8; Settling Time: 800ns; Single Supply: Yes; DatasheetVersion: Rev.A; PackageVersion: Oct-2004; PackageReference: D-16; PackageDescription: 16-Lead Side-Brazed Ceramic Dual In-Line Package [SBDIP]; Supplier 1: Digi-Key; Supplier Part Number 1: AD558TD-ND; Supplier 2: Newark; Supplier Part Number 2: 05F6983; Supplier 3: Mouser; Supplier Part Number 3: 584-AD558TD; Packing: Tube; RoHS: N; Mounting Technology: Through Hole; ComponentLink1Description: Manufacturer URL; ComponentLink1URL: http://www.analog.com/en/index.html; ComponentLink2Description: Datasheet; ComponentLink2URL: http://www.analog.com/static/imported-files/data_sheets/AD558.pdf; ComponentLink3Description: Package Specification; ComponentLink3URL: http://www.analog.com/static/imported-files/packages/411773807540737148809448D_16.pdf; ComponentLink4Description: Product URL; ComponentLink4URL: http://www.analog.com/en/digital-to-analog-converters/da-converters/ad558/products/product.html
footprint D-16 (DIP, 16-Leads, Row Spacing 7.62mm, Pitch 2.54mm, Body 21.3x6.7mm)
pins: 1 (LSB)  DB0 (in), 2 DB1 (in), 3 DB2 (in), 4 DB3 (in), 5 DB4 (in), 6 DB5 (in), 7 DB6 (in), 8 (MSB) DB7 (in), 9 ~{CE} (in), 10 ~{CS} (in), 11 +VCC (power), 12 GND (power), 13 GND (power), 14 VOUTSELECT (in), 15 VOUTSENSE (in), 16 VOUT (out)

## AD558TD/883B
designator U?
Single 8-Bit Low Cost Complete uP-Compatible DACPORT, -55 to +125 degC, D-16, Tube; Generic Part Number: AD558; Manufacturer: Analog Devices; PartNumber: AD558TD/883B; # DAC Outputs: 1; Max V+: 16.5V; Op Pwr Diss: 375mW; Resolution (Bits): 8; Settling Time: 800ns; Single Supply: Yes; DatasheetVersion: Rev.A; PackageVersion: Oct-2004; PackageReference: D-16; PackageDescription: 16-Lead Side-Brazed Ceramic Dual In-Line Package [SBDIP]; Supplier 1: Mouser; Supplier Part Number 1: 584-AD558TD883B; Packing: Tube; RoHS: N; Mounting Technology: Through Hole; ComponentLink1Description: Manufacturer URL; ComponentLink1URL: http://www.analog.com/en/index.html; ComponentLink2Description: Datasheet; ComponentLink2URL: http://www.analog.com/static/imported-files/data_sheets/AD558.pdf; ComponentLink3Description: Package Specification; ComponentLink3URL: http://www.analog.com/static/imported-files/packages/411773807540737148809448D_16.pdf; ComponentLink4Description: Product URL; ComponentLink4URL: http://www.analog.com/en/digital-to-analog-converters/da-converters/ad558/products/product.html
footprint D-16 (DIP, 16-Leads, Row Spacing 7.62mm, Pitch 2.54mm, Body 21.3x6.7mm)
pins: 1 (LSB)  DB0 (in), 2 DB1 (in), 3 DB2 (in), 4 DB3 (in), 5 DB4 (in), 6 DB5 (in), 7 DB6 (in), 8 (MSB) DB7 (in), 9 ~{CE} (in), 10 ~{CS} (in), 11 +VCC (power), 12 GND (power), 13 GND (power), 14 VOUTSELECT (in), 15 VOUTSENSE (in), 16 VOUT (out)

## AD558TE/883B
designator U?
Single 8-Bit Low Cost Complete uP-Compatible DACPORT, -55 to +125 degC, E-20-1, Tube; Generic Part Number: AD558; Manufacturer: Analog Devices; PartNumber: AD558TE/883B; # DAC Outputs: 1; Max V+: 16.5V; Op Pwr Diss: 375mW; Resolution (Bits): 8; Settling Time: 800ns; Single Supply: Yes; DatasheetVersion: Rev.A; PackageVersion: 022106-A; PackageReference: E-20-1; PackageDescription: 20-Terminal Ceramic Leadless Chip Carrier [LCC]; Supplier 1: Mouser; Supplier Part Number 1: 584-AD558TE883B; Packing: Tube; RoHS: N; Mounting Technology: Surface Mount; ComponentLink1Description: Manufacturer URL; ComponentLink1URL: http://www.analog.com/en/index.html; ComponentLink2Description: Datasheet; ComponentLink2URL: http://www.analog.com/static/imported-files/data_sheets/AD558.pdf; ComponentLink3Description: Package Specification; ComponentLink3URL: http://www.analog.com/static/imported-files/packages/PKG_PDF/LCC(E)/E_20_1.pdf; ComponentLink4Description: Product URL; ComponentLink4URL: http://www.analog.com/en/digital-to-analog-converters/da-converters/ad558/products/product.html
footprint E-20-1_N (Leadless Chip Carrier, 20-Leads, Body 8.9x8.9mm, Pitch 1.27mm, IPC Medium Density)
footprint E-20-1_L (Leadless Chip Carrier, 20-Leads, Body 8.9x8.9mm, Pitch 1.27mm, IPC High Density)
footprint E-20-1_M (Leadless Chip Carrier, 20-Leads, Body 8.9x8.9mm, Pitch 1.27mm, IPC Low Density)
pins: 1 NC, 2 DB0 (LSB) (in), 3 DB1 (in), 4 DB2 (in), 5 DB3 (in), 6 NC, 7 DB4 (in), 8 DB5 (in), 9 DB6 (in), 10 (MSB) DB7 (in), 11 NC, 12 ~{CE} (in), 13 ~{CS} (in), 14 +VCC (power), 15 GND (power), 16 NC, 17 GND (power), 18 VOUT SELECT (in), 19 VOUT SENSE (in), 20 VOUT (out)

## AD660AN
designator U?
Single 16-Bit Monolithic DACPORT, -40 to +85 degC, N-24-1, Tube; Generic Part Number: AD660; Manufacturer: Analog Devices; PartNumber: AD660AN; # DAC Outputs: 1; Max V+: 16.5V; Op Pwr Diss: 625mW; Resolution (Bits): 16; Settling Time: 6µs; Single Supply: No; DatasheetVersion: Rev.B; PackageVersion: 071006-A; PackageReference: N-24-1; PackageDescription: 24-Lead Plastic Dual In-Line Package [PDIP] Narrow Body; Supplier 1: Digi-Key; Supplier Part Number 1: AD660AN-ND; Supplier 2: Newark; Supplier Part Number 2: 66F5806; Supplier 3: Mouser; Supplier Part Number 3: 584-AD660AN; Packing: Tube; RoHS: N; Mounting Technology: Through Hole; Code_JEDEC: MS-001; ComponentLink1Description: Manufacturer URL; ComponentLink1URL: http://www.analog.com/en/index.html; ComponentLink2Description: Datasheet; ComponentLink2URL: http://www.analog.com/static/imported-files/data_sheets/AD660.pdf; ComponentLink3Description: Package Specification; ComponentLink3URL: http://www.analog.com/static/imported-files/packages/50726455539629N_24_1.pdf; ComponentLink4Description: Product URL; ComponentLink4URL: http://www.analog.com/en/digital-to-analog-converters/da-converters/ad660/products/product.html
footprint N-24-1 (DIP, 24-Leads, Row Spacing 7.62mm, Pitch 2.54mm, Body 31.9x6.6mm)
pins: 1 -VEE (power) "Negative Analog Supply Pin", 2 +VCC (power) "Positive Analog Supply Pin", 3 +VLL (power) "Digital Supply Pin", 4 DGND (power) "Digital Ground Reference Pin", 5 DB7/DB15 (in) "DB7 and DB15 Byte Load Data Input Pin", 6 DB6/DB14 (in) "DB6 and DB14 Byte Load Data Input Pin", 7 DB5/DB13 (in) "DB5 and DB13 Byte Load Data Input Pin", 8 DB4/DB12 (in) "DB4 and DB12 Byte Load Data Input Pin", 9 DB3/DB11 (in) "DB3 and DB11 Byte Load Data Input Pin", 10 DB2/DB10 (in) "DB2 and DB10 Byte Load Data Input Pin", 11 DB1/DB9/DATADIR (in) "DB1 and DB9 Byte Load Data Input Pin/MSB or L\S\B\ First Data Direction Serial Input Select Pin", 12 DB0/DB8/SIN (in) "DB0 and DB8 Byte Load Data Input Pin/Serial Data Input Pin", 13 SOUT (out) "Serial Data Output Pin", 14 ~{CS} (in) "Chip Select Pin", 15 ~{LBE}/CLEAR SELECT (in) "Low Byte Enable Pin/U\n\i\p\o\l\ar or Bipolar Clear Select Pin", 16 ~{HBE} (in) "High Byte Enable Pin", 17 ~{SER} (in) "Serial Input Enable Pin", 18 ~{CLR} (in) "Output Clear Pin", 19 LDAC (in) "Load DAC Pin", 20 AGND (power) "Analog Ground Reference Pin", 21 VOUT (out) "Voltage Output Pin", 22 SPAN/BIPOLAR OFFSET (in) "Output Span Configuration Pin", 23 REF IN (in) "External Reference Voltage Input Pin", 24 REF OUT (out) "Internal Reference Voltage Output Pin"

## AD660AR
designator U?
Single 16-Bit Monolithic DACPORT, -40 to +85 degC, RW-24, Tube; Generic Part Number: AD660; Manufacturer: Analog Devices; PartNumber: AD660AR; # DAC Outputs: 1; Max V+: 16.5V; Op Pwr Diss: 625mW; Resolution (Bits): 16; Settling Time: 6µs; Single Supply: No; DatasheetVersion: Rev.B; PackageVersion: 060706-A; PackageReference: RW-24; PackageDescription: 24-Lead Standard Small Outline Package [SOIC_W]; Supplier 1: Digi-Key; Supplier Part Number 1: AD660AR-ND; Supplier 2: Mouser; Supplier Part Number 2: 584-AD660AR; Packing: Tube; RoHS: N; Mounting Technology: Surface Mount; Code_JEDEC: MS-013-AD; ComponentLink1Description: Manufacturer URL; ComponentLink1URL: http://www.analog.com/en/index.html; ComponentLink2Description: Datasheet; ComponentLink2URL: http://www.analog.com/static/imported-files/data_sheets/AD660.pdf; ComponentLink3Description: Package Specification; ComponentLink3URL: http://www.analog.com/static/imported-files/packages/33665150946139RW_24.pdf; ComponentLink4Description: Product URL; ComponentLink4URL: http://www.analog.com/en/digital-to-analog-converters/da-converters/ad660/products/product.html
footprint RW-24_N (SOIC, 24-Leads, Body 15.4x7.5mm, Pitch 1.27mm, IPC Medium Density)
footprint RW-24_L (SOIC, 24-Leads, Body 15.4x7.5mm, Pitch 1.27mm, IPC High Density)
footprint RW-24_M (SOIC, 24-Leads, Body 15.4x7.5mm, Pitch 1.27mm, IPC Low Density)
pins: 1 -VEE (power) "Negative Analog Supply Pin", 2 +VCC (power) "Positive Analog Supply Pin", 3 +VLL (power) "Digital Supply Pin", 4 DGND (power) "Digital Ground Reference Pin", 5 DB7/DB15 (in) "DB7 and DB15 Byte Load Data Input Pin", 6 DB6/DB14 (in) "DB6 and DB14 Byte Load Data Input Pin", 7 DB5/DB13 (in) "DB5 and DB13 Byte Load Data Input Pin", 8 DB4/DB12 (in) "DB4 and DB12 Byte Load Data Input Pin", 9 DB3/DB11 (in) "DB3 and DB11 Byte Load Data Input Pin", 10 DB2/DB10 (in) "DB2 and DB10 Byte Load Data Input Pin", 11 DB1/DB9/DATADIR (in) "DB1 and DB9 Byte Load Data Input Pin/MSB or L\S\B\ First Data Direction Serial Input Select Pin", 12 DB0/DB8/SIN (in) "DB0 and DB8 Byte Load Data Input Pin/Serial Data Input Pin", 13 SOUT (out) "Serial Data Output Pin", 14 ~{CS} (in) "Chip Select Pin", 15 ~{LBE}/CLEAR SELECT (in) "Low Byte Enable Pin/U\n\i\p\o\l\a\r\ or Bipolar Clear Select Pin", 16 ~{HBE} (in) "High Byte Enable Pin", 17 ~{SER} (in) "Serial Input Enable Pin", 18 ~{CLR} (in) "Output Clear Pin", 19 LDAC (in) "Load DAC Pin", 20 AGND (power) "Analog Ground Reference Pin", 21 VOUT (out) "Voltage Output Pin", 22 SPAN/BIPOLAR OFFSET (in) "Output Span Configuration Pin", 23 REF IN (in) "External Reference Voltage Input Pin", 24 REF OUT (out) "Internal Reference Voltage Output Pin"

## AD660AR-REEL
designator U?
Single 16-Bit Monolithic DACPORT, -40 to +85 degC, RW-24, Reel; Generic Part Number: AD660; Manufacturer: Analog Devices; PartNumber: AD660AR-REEL; # DAC Outputs: 1; Max V+: 16.5V; Op Pwr Diss: 625mW; Resolution (Bits): 16; Settling Time: 6µs; Single Supply: No; DatasheetVersion: Rev.B; PackageVersion: 060706-A; PackageReference: RW-24; PackageDescription: 24-Lead Standard Small Outline Package [SOIC_W]; Supplier 1: Mouser; Supplier Part Number 1: N/A; Packing: Reel; RoHS: N; Mounting Technology: Surface Mount; Code_JEDEC: MS-013-AD; ComponentLink1Description: Manufacturer URL; ComponentLink1URL: http://www.analog.com/en/index.html; ComponentLink2Description: Datasheet; ComponentLink2URL: http://www.analog.com/static/imported-files/data_sheets/AD660.pdf; ComponentLink3Description: Package Specification; ComponentLink3URL: http://www.analog.com/static/imported-files/packages/33665150946139RW_24.pdf; ComponentLink4Description: Product URL; ComponentLink4URL: http://www.analog.com/en/digital-to-analog-converters/da-converters/ad660/products/product.html
footprint RW-24_N (SOIC, 24-Leads, Body 15.4x7.5mm, Pitch 1.27mm, IPC Medium Density)
footprint RW-24_L (SOIC, 24-Leads, Body 15.4x7.5mm, Pitch 1.27mm, IPC High Density)
footprint RW-24_M (SOIC, 24-Leads, Body 15.4x7.5mm, Pitch 1.27mm, IPC Low Density)
pins: 1 -VEE (power) "Negative Analog Supply Pin", 2 +VCC (power) "Positive Analog Supply Pin", 3 +VLL (power) "Digital Supply Pin", 4 DGND (power) "Digital Ground Reference Pin", 5 DB7/DB15 (in) "DB7 and DB15 Byte Load Data Input Pin", 6 DB6/DB14 (in) "DB6 and DB14 Byte Load Data Input Pin", 7 DB5/DB13 (in) "DB5 and DB13 Byte Load Data Input Pin", 8 DB4/DB12 (in) "DB4 and DB12 Byte Load Data Input Pin", 9 DB3/DB11 (in) "DB3 and DB11 Byte Load Data Input Pin", 10 DB2/DB10 (in) "DB2 and DB10 Byte Load Data Input Pin", 11 DB1/DB9/DATADIR (in) "DB1 and DB9 Byte Load Data Input Pin/MSB or L\S\B\ First Data Direction Serial Input Select Pin", 12 DB0/DB8/SIN (in) "DB0 and DB8 Byte Load Data Input Pin/Serial Data Input Pin", 13 SOUT (out) "Serial Data Output Pin", 14 ~{CS} (in) "Chip Select Pin", 15 ~{LBE}/CLEAR SELECT (in) "Low Byte Enable Pin/U\n\i\p\o\l\a\r\ or Bipolar Clear Select Pin", 16 ~{HBE} (in) "High Byte Enable Pin", 17 ~{SER} (in) "Serial Input Enable Pin", 18 ~{CLR} (in) "Output Clear Pin", 19 LDAC (in) "Load DAC Pin", 20 AGND (power) "Analog Ground Reference Pin", 21 VOUT (out) "Voltage Output Pin", 22 SPAN/BIPOLAR OFFSET (in) "Output Span Configuration Pin", 23 REF IN (in) "External Reference Voltage Input Pin", 24 REF OUT (out) "Internal Reference Voltage Output Pin"

## AD660ARZ
designator U?
Single 16-Bit Monolithic DACPORT, -40 to +85 degC, RW-24, Pb-Free, Tube; Generic Part Number: AD660; Manufacturer: Analog Devices; PartNumber: AD660ARZ; # DAC Outputs: 1; Max V+: 16.5V; Op Pwr Diss: 625mW; Resolution (Bits): 16; Settling Time: 6µs; Single Supply: No; DatasheetVersion: Rev.B; PackageVersion: 060706-A; PackageReference: RW-24; PackageDescription: 24-Lead Standard Small Outline Package [SOIC_W]; Supplier 1: Digi-Key; Supplier Part Number 1: AD660ARZ-ND; Supplier 2: Newark; Supplier Part Number 2: 12M8704; Supplier 3: Mouser; Supplier Part Number 3: 584-AD660ARZ; Packing: Tube; RoHS: Y; Mounting Technology: Surface Mount; Code_JEDEC: MS-013-AD; ComponentLink1Description: Manufacturer URL; ComponentLink1URL: http://www.analog.com/en/index.html; ComponentLink2Description: Datasheet; ComponentLink2URL: http://www.analog.com/static/imported-files/data_sheets/AD660.pdf; ComponentLink3Description: Package Specification; ComponentLink3URL: http://www.analog.com/static/imported-files/packages/33665150946139RW_24.pdf; ComponentLink4Description: Product URL; ComponentLink4URL: http://www.analog.com/en/digital-to-analog-converters/da-converters/ad660/products/product.html
footprint RW-24_N (SOIC, 24-Leads, Body 15.4x7.5mm, Pitch 1.27mm, IPC Medium Density)
footprint RW-24_L (SOIC, 24-Leads, Body 15.4x7.5mm, Pitch 1.27mm, IPC High Density)
footprint RW-24_M (SOIC, 24-Leads, Body 15.4x7.5mm, Pitch 1.27mm, IPC Low Density)
pins: 1 -VEE (power) "Negative Analog Supply Pin", 2 +VCC (power) "Positive Analog Supply Pin", 3 +VLL (power) "Digital Supply Pin", 4 DGND (power) "Digital Ground Reference Pin", 5 DB7/DB15 (in) "DB7 and DB15 Byte Load Data Input Pin", 6 DB6/DB14 (in) "DB6 and DB14 Byte Load Data Input Pin", 7 DB5/DB13 (in) "DB5 and DB13 Byte Load Data Input Pin", 8 DB4/DB12 (in) "DB4 and DB12 Byte Load Data Input Pin", 9 DB3/DB11 (in) "DB3 and DB11 Byte Load Data Input Pin", 10 DB2/DB10 (in) "DB2 and DB10 Byte Load Data Input Pin", 11 DB1/DB9/DATADIR (in) "DB1 and DB9 Byte Load Data Input Pin/MSB or L\S\B\ First Data Direction Serial Input Select Pin", 12 DB0/DB8/SIN (in) "DB0 and DB8 Byte Load Data Input Pin/Serial Data Input Pin", 13 SOUT (out) "Serial Data Output Pin", 14 ~{CS} (in) "Chip Select Pin", 15 ~{LBE}/CLEAR SELECT (in) "Low Byte Enable Pin/U\n\i\p\o\l\a\r\ or Bipolar Clear Select Pin", 16 ~{HBE} (in) "High Byte Enable Pin", 17 ~{SER} (in) "Serial Input Enable Pin", 18 ~{CLR} (in) "Output Clear Pin", 19 LDAC (in) "Load DAC Pin", 20 AGND (power) "Analog Ground Reference Pin", 21 VOUT (out) "Voltage Output Pin", 22 SPAN/BIPOLAR OFFSET (in) "Output Span Configuration Pin", 23 REF IN (in) "External Reference Voltage Input Pin", 24 REF OUT (out) "Internal Reference Voltage Output Pin"